# Altium footprint library Package_SO.PcbLib: 333 footprints (part 10 of 21)
Each footprint in its own frame and in the unit in brackets; x right, y up, seen from the top. Pads: shape width x height; smd on the part's side, far side on the other; paste and mask are expansions set on the pad; w line width, h text height; cw(c..) or ccw(c..) is an arc to the next point about the centre after c.
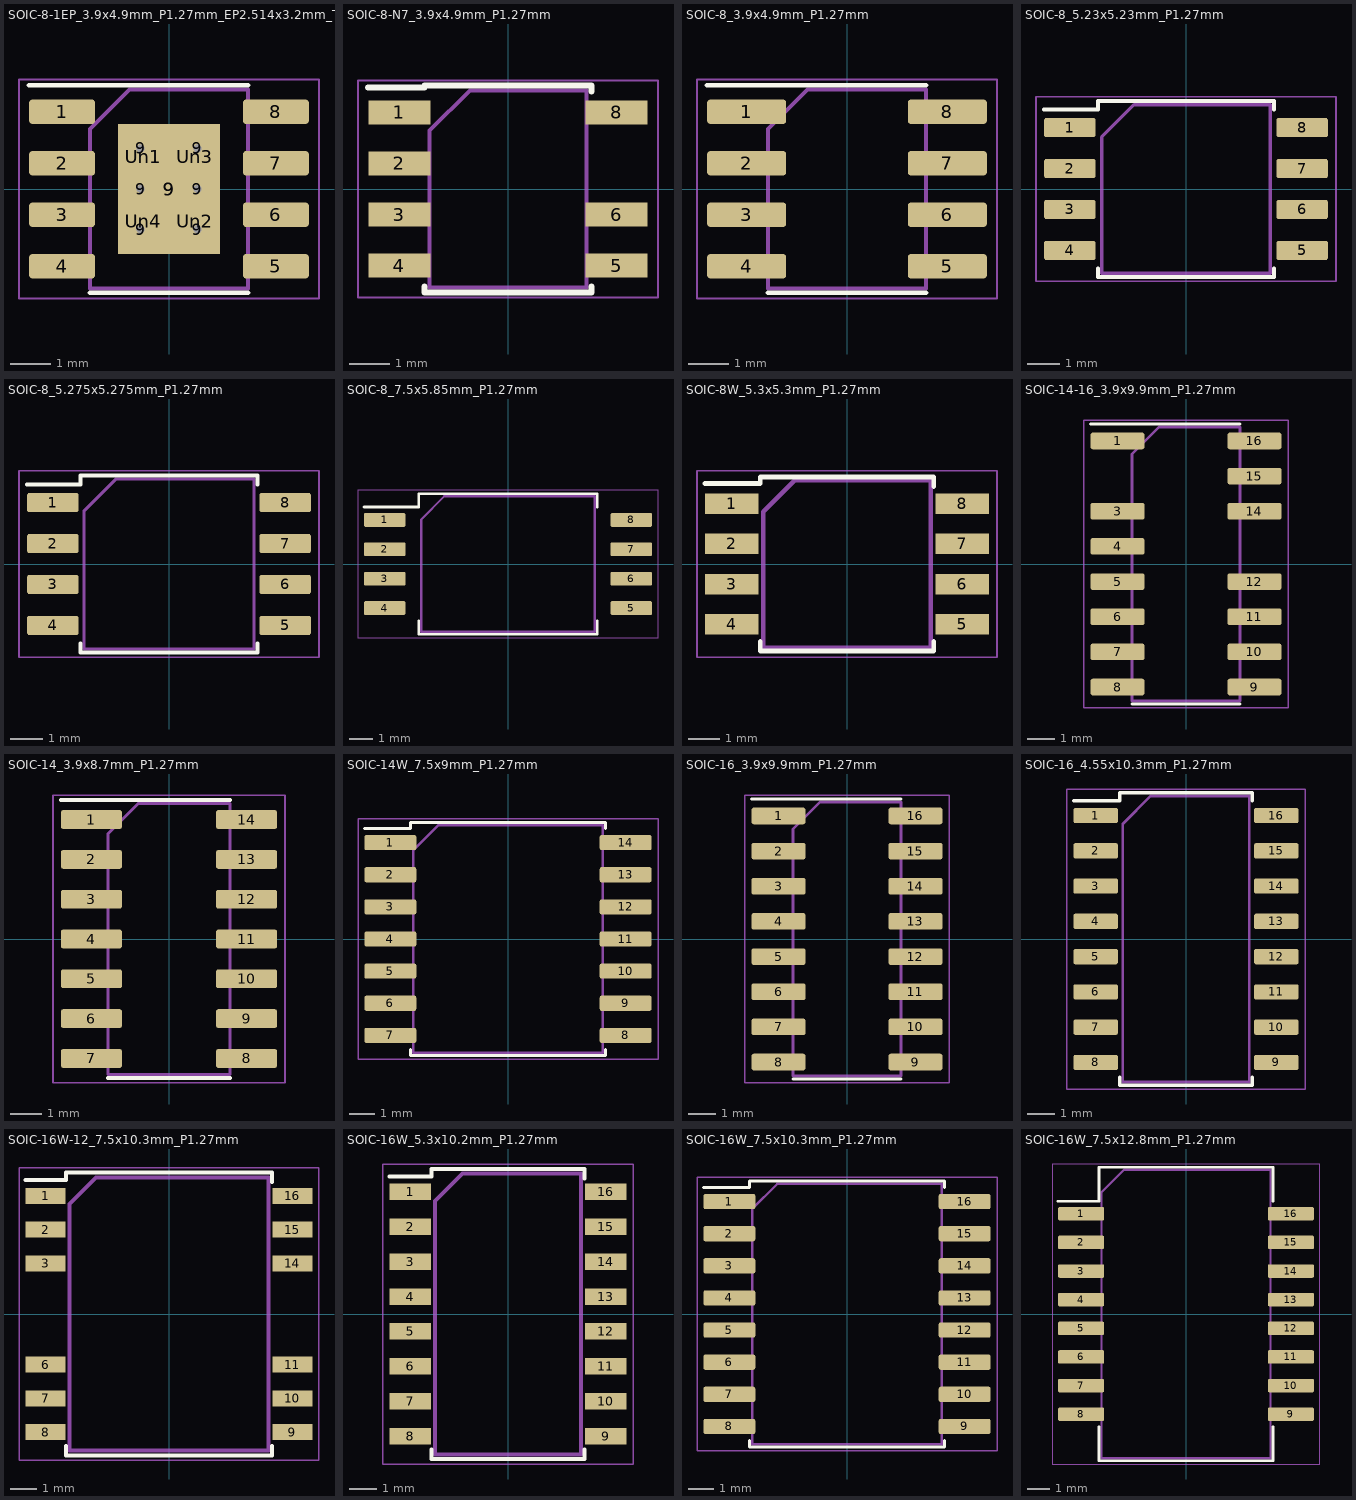
[diagram p9: the footprints below, top view; thin cyan lines are the x and y axes]

## SOIC-8-1EP_3.9x4.9mm_P1.27mm_EP2.514x3.2mm_ThermalVias [mm]
pads (20):
  rrect25% 1.625x0.6 smd: 1(-2.638,1.905) 2(-2.638,0.635) 3(-2.638,-0.635) 4(-2.638,-1.905) 5(2.638,-1.905) 6(2.638,-0.635) 7(2.638,0.635) 8(2.638,1.905)
  round 0.5 hole 0.2: 9(-0.7,-1) 9(-0.7,0) 9(-0.7,1) 9(0.7,-1) 9(0.7,0) 9(0.7,1)
  rect 1.9x2.5 smd far side: 9(0,0)
  rect 2.514x3.2 smd: 9(0,0)
  rrect24% 1.05x1.34 on Top Paste: Un1(-0.63,0.8) Un2(0.63,-0.8) Un3(0.63,0.8) Un4(-0.63,-0.8)
F.SilkS:
  lines w0.12: -3.45,2.56 0,2.56 1.95,2.56 ; -1.95,-2.56 0,-2.56 1.95,-2.56
F.CrtYd:
  lines w0.05: -3.7,-2.7 3.7,-2.7 3.7,2.7 -3.7,2.7 -3.7,-2.7
F.Fab:
  lines w0.1: -1.95,-2.45 -1.95,1.475 -0.975,2.45 1.95,2.45 1.95,-2.45 -1.95,-2.45
  text "'.Designator'" at -3.969,-0.827 h0.98

## SOIC-8-N7_3.9x4.9mm_P1.27mm [mm]
pads (7):
  rect 1.55x0.6 smd: 1(-2.7,1.905) 2(-2.7,0.635) 3(-2.7,-0.635) 4(-2.7,-1.905) 5(2.7,-1.905) 6(2.7,-0.635) 8(2.7,1.905)
F.SilkS:
  lines w0.15: -3.475,2.525 -2.075,2.525 -2.075,2.575 2.075,2.575 2.075,2.43 ; -2.075,-2.43 -2.075,-2.575 2.075,-2.575 2.075,-2.43
F.CrtYd:
  lines w0.05: -3.73,-2.7 -3.73,2.7 3.73,2.7 3.73,-2.7 -3.73,-2.7
F.Fab:
  lines w0.1: -1.95,-2.45 -1.95,1.45 -0.95,2.45 1.95,2.45 1.95,-2.45 -1.95,-2.45
  text "'.Designator'" at -4.047,-0.84 h1

## SOIC-8_3.9x4.9mm_P1.27mm [mm]
pads (8):
  rrect25% 1.95x0.6 smd: 1(-2.475,1.905) 2(-2.475,0.635) 3(-2.475,-0.635) 4(-2.475,-1.905) 5(2.475,-1.905) 6(2.475,-0.635) 7(2.475,0.635) 8(2.475,1.905)
F.SilkS:
  lines w0.12: -3.45,2.56 0,2.56 1.95,2.56 ; -1.95,-2.56 0,-2.56 1.95,-2.56
F.CrtYd:
  lines w0.05: -3.7,-2.7 -3.7,2.7 3.7,2.7 3.7,-2.7 -3.7,-2.7
F.Fab:
  lines w0.1: -1.95,-2.45 -1.95,1.475 -0.975,2.45 1.95,2.45 1.95,-2.45 -1.95,-2.45
  text "'.Designator'" at -3.969,-0.827 h0.98

## SOIC-8_5.23x5.23mm_P1.27mm [mm]
pads (8):
  rrect25% 1.6x0.6 smd: 1(-3.6,1.905) 2(-3.6,0.635) 3(-3.6,-0.635) 4(-3.6,-1.905) 5(3.6,-1.905) 6(3.6,-0.635) 7(3.6,0.635) 8(3.6,1.905)
F.SilkS:
  lines w0.12: -4.4,2.465 -2.725,2.465 -2.725,2.725 0,2.725 2.725,2.725 2.725,2.465 ; -2.725,-2.465 -2.725,-2.725 0,-2.725 2.725,-2.725 2.725,-2.465
F.CrtYd:
  lines w0.05: -4.65,-2.86 4.65,-2.86 4.65,2.86 -4.65,2.86 -4.65,-2.86
F.Fab:
  lines w0.1: -2.615,-2.615 -2.615,1.615 -1.615,2.615 2.615,2.615 2.615,-2.615 -2.615,-2.615
  text "'.Designator'" at -4.047,-0.84 h1

## SOIC-8_5.275x5.275mm_P1.27mm [mm]
pads (8):
  rrect25% 1.6x0.6 smd: 1(-3.6,1.905) 2(-3.6,0.635) 3(-3.6,-0.635) 4(-3.6,-1.905) 5(3.6,-1.905) 6(3.6,-0.635) 7(3.6,0.635) 8(3.6,1.905)
F.SilkS:
  lines w0.12: -4.4,2.465 -2.748,2.465 -2.748,2.748 0,2.748 2.748,2.748 2.748,2.465 ; -2.748,-2.465 -2.748,-2.748 0,-2.748 2.748,-2.748 2.748,-2.465
F.CrtYd:
  lines w0.05: -4.65,-2.89 4.65,-2.89 4.65,2.89 -4.65,2.89 -4.65,-2.89
F.Fab:
  lines w0.1: -2.638,-2.638 -2.638,1.637 -1.637,2.638 2.638,2.638 2.638,-2.638 -2.638,-2.638
  text "'.Designator'" at -4.047,-0.84 h1

## SOIC-8_7.5x5.85mm_P1.27mm [mm]
pads (8):
  rrect25% 1.8x0.6 smd: 1(-5.325,1.905) 2(-5.325,0.635) 3(-5.325,-0.635) 4(-5.325,-1.905) 5(5.325,-1.905) 6(5.325,-0.635) 7(5.325,0.635) 8(5.325,1.905)
F.SilkS:
  lines w0.12: -6.225,2.465 -3.86,2.465 -3.86,3.035 0,3.035 3.86,3.035 3.86,2.465 ; -3.86,-2.465 -3.86,-3.035 0,-3.035 3.86,-3.035 3.86,-2.465
F.CrtYd:
  lines w0.05: -6.48,-3.18 -6.48,3.18 6.48,3.18 6.48,-3.18 -6.48,-3.18
F.Fab:
  lines w0.1: -3.75,-2.925 3.75,-2.925 3.75,2.925 -2.75,2.925 -3.75,1.925 -3.75,-2.925
  text "'.Designator'" at -4.047,-0.84 h1

## SOIC-8W_5.3x5.3mm_P1.27mm [mm]
pads (8):
  rect 1.7x0.65 smd: 1(-3.65,1.905) 2(-3.65,0.635) 3(-3.65,-0.635) 4(-3.65,-1.905) 5(3.65,-1.905) 6(3.65,-0.635) 7(3.65,0.635) 8(3.65,1.905)
F.SilkS:
  lines w0.15: -4.5,2.55 -2.75,2.55 -2.75,2.755 2.75,2.755 2.75,2.455 ; -2.75,-2.455 -2.75,-2.755 2.75,-2.755 2.75,-2.455
F.CrtYd:
  lines w0.05: -4.75,-2.95 -4.75,2.95 4.75,2.95 4.75,-2.95 -4.75,-2.95
F.Fab:
  lines w0.15: -2.65,-2.65 2.65,-2.65 2.65,2.65 -1.65,2.65 -2.65,1.65 -2.65,-2.65
  text "'.Designator'" at -4.047,-0.84 h1

## SOIC-14-16_3.9x9.9mm_P1.27mm [mm]
pads (14):
  rrect25% 1.95x0.6 smd: 1(-2.475,4.445) 3(-2.475,1.905) 4(-2.475,0.635) 5(-2.475,-0.635) 6(-2.475,-1.905) 7(-2.475,-3.175) 8(-2.475,-4.445) 9(2.475,-4.445) 10(2.475,-3.175) 11(2.475,-1.905) 12(2.475,-0.635) 14(2.475,1.905) 15(2.475,3.175) 16(2.475,4.445)
F.SilkS:
  lines w0.12: -3.45,5.06 0,5.06 1.95,5.06 ; -1.95,-5.06 0,-5.06 1.95,-5.06
F.CrtYd:
  lines w0.05: -3.7,-5.2 -3.7,5.2 3.7,5.2 3.7,-5.2 -3.7,-5.2
F.Fab:
  lines w0.1: -1.95,-4.95 -1.95,3.975 -0.975,4.95 1.95,4.95 1.95,-4.95 -1.95,-4.95
  text "'.Designator'" at -3.969,-0.827 h0.98

## SOIC-14_3.9x8.7mm_P1.27mm [mm]
pads (14):
  rrect25% 1.95x0.6 smd: 1(-2.475,3.81) 2(-2.475,2.54) 3(-2.475,1.27) 4(-2.475,0) 5(-2.475,-1.27) 6(-2.475,-2.54) 7(-2.475,-3.81) 8(2.475,-3.81) 9(2.475,-2.54) 10(2.475,-1.27) 11(2.475,0) 12(2.475,1.27) 13(2.475,2.54) 14(2.475,3.81)
F.SilkS:
  lines w0.12: -3.45,4.435 0,4.435 1.95,4.435 ; -1.95,-4.435 0,-4.435 1.95,-4.435
F.CrtYd:
  lines w0.05: -3.7,-4.58 -3.7,4.58 3.7,4.58 3.7,-4.58 -3.7,-4.58
F.Fab:
  lines w0.1: -1.95,-4.325 1.95,-4.325 1.95,4.325 -0.975,4.325 -1.95,3.35 -1.95,-4.325
  text "'.Designator'" at -3.969,-0.827 h0.98

## SOIC-14W_7.5x9mm_P1.27mm [mm]
pads (14):
  rrect25% 2.05x0.6 smd: 1(-4.65,3.81) 2(-4.65,2.54) 3(-4.65,1.27) 4(-4.65,0) 5(-4.65,-1.27) 6(-4.65,-2.54) 7(-4.65,-3.81) 8(4.65,-3.81) 9(4.65,-2.54) 10(4.65,-1.27) 11(4.65,0) 12(4.65,1.27) 13(4.65,2.54) 14(4.65,3.81)
F.SilkS:
  lines w0.12: -5.675,4.37 -3.86,4.37 -3.86,4.61 0,4.61 3.86,4.61 3.86,4.37 ; -3.86,-4.37 -3.86,-4.61 0,-4.61 3.86,-4.61 3.86,-4.37
F.CrtYd:
  lines w0.05: -5.93,-4.75 5.93,-4.75 5.93,4.75 -5.93,4.75 -5.93,-4.75
F.Fab:
  lines w0.1: -3.75,-4.5 -3.75,3.5 -2.75,4.5 3.75,4.5 3.75,-4.5 -3.75,-4.5
  text "'.Designator'" at -4.047,-0.84 h1

## SOIC-16_3.9x9.9mm_P1.27mm [mm]
pads (16):
  rrect25% 1.95x0.6 smd: 1(-2.475,4.445) 2(-2.475,3.175) 3(-2.475,1.905) 4(-2.475,0.635) 5(-2.475,-0.635) 6(-2.475,-1.905) 7(-2.475,-3.175) 8(-2.475,-4.445) 9(2.475,-4.445) 10(2.475,-3.175) 11(2.475,-1.905) 12(2.475,-0.635) 13(2.475,0.635) 14(2.475,1.905) 15(2.475,3.175) 16(2.475,4.445)
F.SilkS:
  lines w0.12: -3.45,5.06 0,5.06 1.95,5.06 ; -1.95,-5.06 0,-5.06 1.95,-5.06
F.CrtYd:
  lines w0.05: -3.7,-5.2 -3.7,5.2 3.7,5.2 3.7,-5.2 -3.7,-5.2
F.Fab:
  lines w0.1: -1.95,-4.95 -1.95,3.975 -0.975,4.95 1.95,4.95 1.95,-4.95 -1.95,-4.95
  text "'.Designator'" at -3.969,-0.827 h0.98

## SOIC-16_4.55x10.3mm_P1.27mm [mm]
pads (16):
  rrect25% 1.6x0.55 smd: 1(-3.25,4.445) 2(-3.25,3.175) 3(-3.25,1.905) 4(-3.25,0.635) 5(-3.25,-0.635) 6(-3.25,-1.905) 7(-3.25,-3.175) 8(-3.25,-4.445) 9(3.25,-4.445) 10(3.25,-3.175) 11(3.25,-1.905) 12(3.25,-0.635) 13(3.25,0.635) 14(3.25,1.905) 15(3.25,3.175) 16(3.25,4.445)
F.SilkS:
  lines w0.12: -4.05,4.98 -2.385,4.98 -2.385,5.26 0,5.26 2.385,5.26 2.385,4.98 ; -2.385,-4.98 -2.385,-5.26 0,-5.26 2.385,-5.26 2.385,-4.98
F.CrtYd:
  lines w0.05: -4.3,-5.4 4.3,-5.4 4.3,5.4 -4.3,5.4 -4.3,-5.4
F.Fab:
  lines w0.1: -2.275,-5.15 -2.275,4.15 -1.275,5.15 2.275,5.15 2.275,-5.15 -2.275,-5.15
  text "'.Designator'" at -4.047,-0.84 h1

## SOIC-16W-12_7.5x10.3mm_P1.27mm [mm]
pads (12):
  rect 1.5x0.6 smd: 1(-4.65,4.445) 2(-4.65,3.175) 3(-4.65,1.905) 6(-4.65,-1.905) 7(-4.65,-3.175) 8(-4.65,-4.445) 9(4.65,-4.445) 10(4.65,-3.175) 11(4.65,-1.905) 14(4.65,1.905) 15(4.65,3.175) 16(4.65,4.445)
F.SilkS:
  lines w0.15: -5.4,5.05 -3.875,5.05 -3.875,5.325 3.875,5.325 3.875,4.97 ; -3.875,-4.97 -3.875,-5.325 3.875,-5.325 3.875,-4.97
F.CrtYd:
  lines w0.05: -5.65,-5.5 -5.65,5.5 5.65,5.5 5.65,-5.5 -5.65,-5.5
F.Fab:
  lines w0.15: -3.75,-5.15 -3.75,4.15 -2.75,5.15 3.75,5.15 3.75,-5.15 -3.75,-5.15
  text "'.Designator'" at -4.047,-0.84 h1

## SOIC-16W_5.3x10.2mm_P1.27mm [mm]
pads (16):
  rect 1.5x0.6 smd: 1(-3.55,4.445) 2(-3.55,3.175) 3(-3.55,1.905) 4(-3.55,0.635) 5(-3.55,-0.635) 6(-3.55,-1.905) 7(-3.55,-3.175) 8(-3.55,-4.445) 9(3.55,-4.445) 10(3.55,-3.175) 11(3.55,-1.905) 12(3.55,-0.635) 13(3.55,0.635) 14(3.55,1.905) 15(3.55,3.175) 16(3.55,4.445)
F.SilkS:
  lines w0.15: -4.3,5 -2.775,5 -2.775,5.275 2.775,5.275 2.775,4.92 ; -2.775,-4.92 -2.775,-5.275 2.775,-5.275 2.775,-4.92
F.CrtYd:
  lines w0.05: -4.55,-5.45 4.55,-5.45 4.55,5.45 -4.55,5.45 -4.55,-5.45
F.Fab:
  lines w0.15: -2.65,-5.1 -2.65,4.1 -1.65,5.1 2.65,5.1 2.65,-5.1 -2.65,-5.1
  text "'.Designator'" at -4.047,-0.84 h1

## SOIC-16W_7.5x10.3mm_P1.27mm [mm]
pads (16):
  rrect25% 2.05x0.6 smd: 1(-4.65,4.445) 2(-4.65,3.175) 3(-4.65,1.905) 4(-4.65,0.635) 5(-4.65,-0.635) 6(-4.65,-1.905) 7(-4.65,-3.175) 8(-4.65,-4.445) 9(4.65,-4.445) 10(4.65,-3.175) 11(4.65,-1.905) 12(4.65,-0.635) 13(4.65,0.635) 14(4.65,1.905) 15(4.65,3.175) 16(4.65,4.445)
F.SilkS:
  lines w0.12: -5.675,5.005 -3.86,5.005 -3.86,5.26 0,5.26 3.86,5.26 3.86,5.005 ; -3.86,-5.005 -3.86,-5.26 0,-5.26 3.86,-5.26 3.86,-5.005
F.CrtYd:
  lines w0.05: -5.93,-5.4 -5.93,5.4 5.93,5.4 5.93,-5.4 -5.93,-5.4
F.Fab:
  lines w0.1: -3.75,-5.15 3.75,-5.15 3.75,5.15 -2.75,5.15 -3.75,4.15 -3.75,-5.15
  text "'.Designator'" at -4.047,-0.84 h1

## SOIC-16W_7.5x12.8mm_P1.27mm [mm]
pads (16):
  rrect25% 2.05x0.6 smd: 1(-4.65,4.445) 2(-4.65,3.175) 3(-4.65,1.905) 4(-4.65,0.635) 5(-4.65,-0.635) 6(-4.65,-1.905) 7(-4.65,-3.175) 8(-4.65,-4.445) 9(4.65,-4.445) 10(4.65,-3.175) 11(4.65,-1.905) 12(4.65,-0.635) 13(4.65,0.635) 14(4.65,1.905) 15(4.65,3.175) 16(4.65,4.445)
F.SilkS:
  lines w0.12: -5.675,5.005 -3.86,5.005 -3.86,6.51 0,6.51 3.86,6.51 3.86,5.005 ; -3.86,-5.005 -3.86,-6.51 0,-6.51 3.86,-6.51 3.86,-5.005
F.CrtYd:
  lines w0.05: -5.93,-6.65 -5.93,6.65 5.93,6.65 5.93,-6.65 -5.93,-6.65
F.Fab:
  lines w0.1: -3.75,-6.4 3.75,-6.4 3.75,6.4 -2.75,6.4 -3.75,5.4 -3.75,-6.4
  text "'.Designator'" at -4.047,-0.84 h1